# Altium footprint library Hydrolib_pcb.PcbLib: 101 footprints (part 4 of 7)
Each footprint in its own frame and in the unit in brackets; x right, y up, seen from the top. Pads: shape width x height; smd on the part's side, far side on the other; paste and mask are expansions set on the pad; w line width, h text height; cw(c..) or ccw(c..) is an arc to the next point about the centre after c.
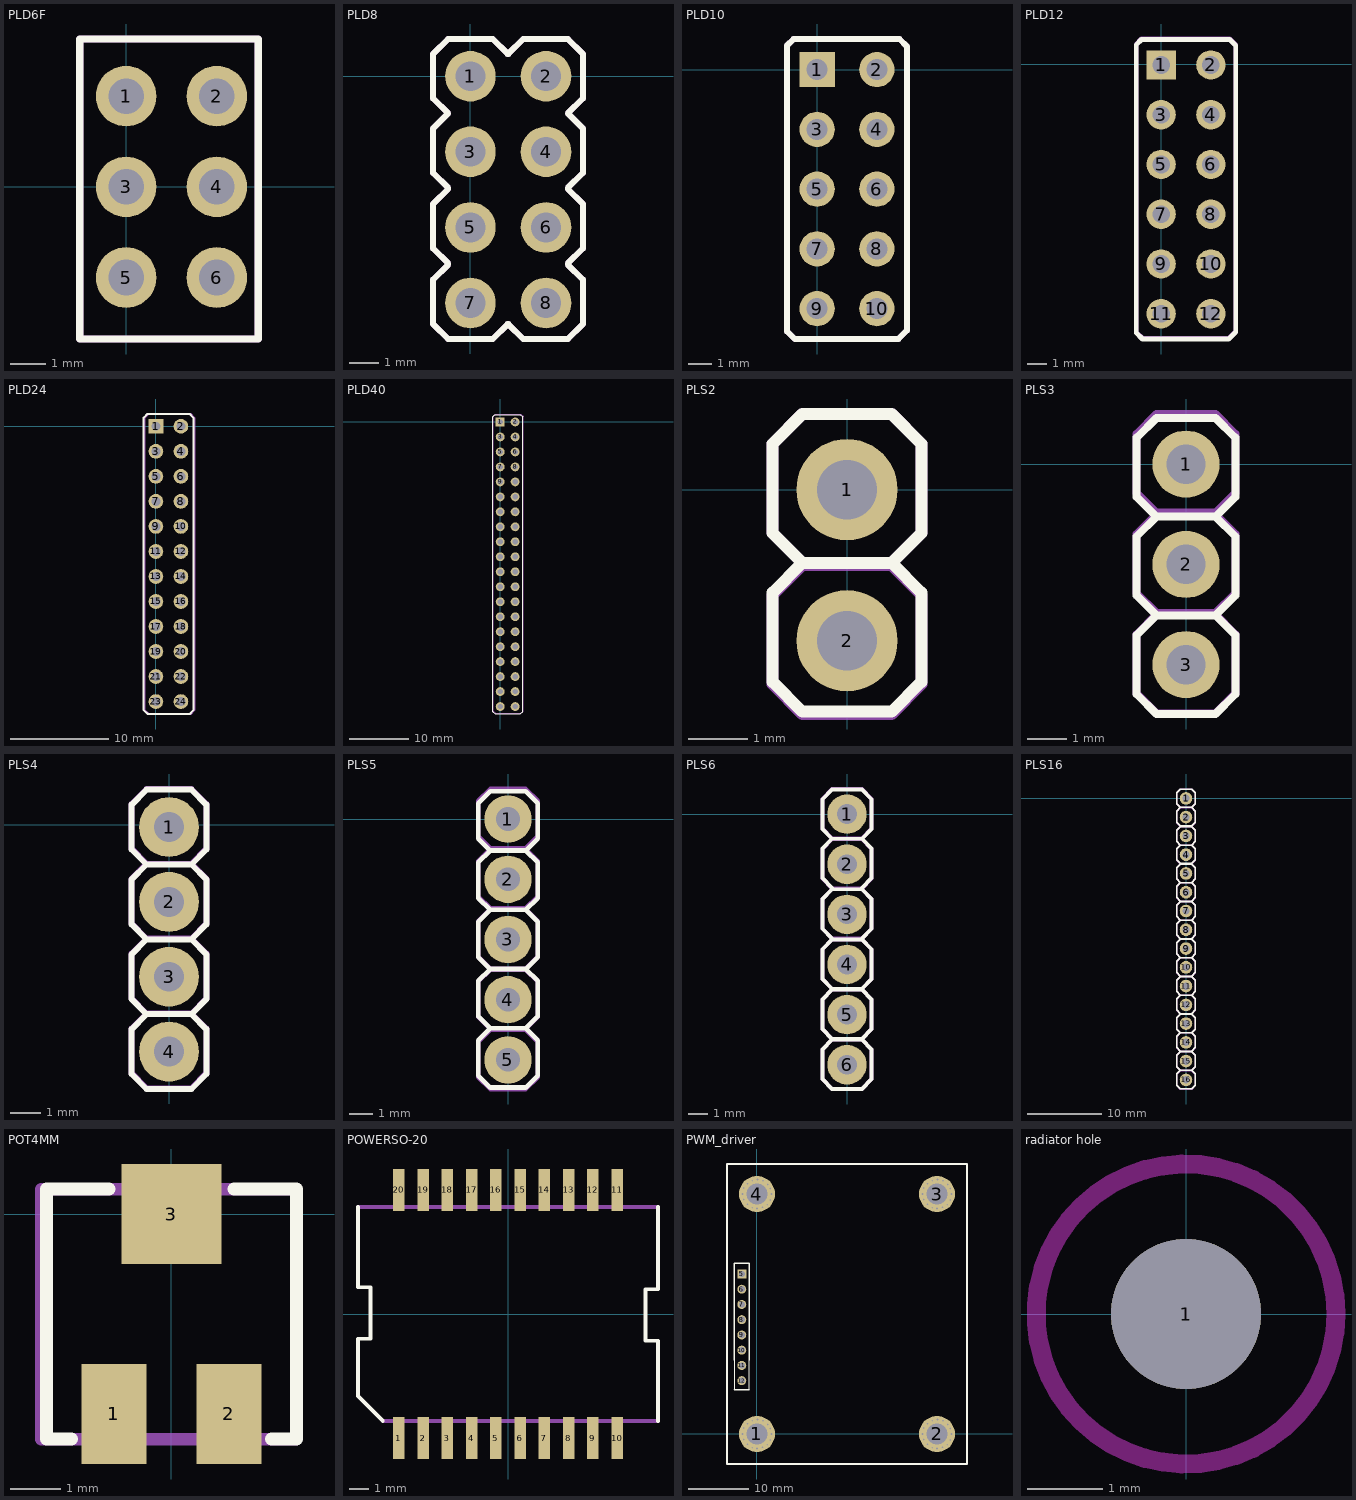
[diagram p3: the footprints below, top view; thin cyan lines are the x and y axes]

## PLD6F [mm]
pads (6):
  round 1.7 hole 1 paste+0: 1(0,2.54) 2(2.54,2.54) 3(0,0) 4(2.54,0) 5(0,-2.54) 6(2.54,-2.54)
Top Overlay:
  lines w0.2: -1.3,-4.26 -1.3,4.14 3.7,4.14 3.7,-4.26 -1.3,-4.26
Pattern top:
  lines w0.2: 3.7,-4.26 3.7,4.14 ; 3.7,-4.26 3.7,4.14 ; 3.7,-4.26 -1.3,-4.26 -1.3,4.14 3.7,4.14
  text ".Designator" at -2.7,5.04 h2.15
3D body "DS1023-2x3SF11.stp": height 8.5, standoff -3, extent -1.3,-4.27 3.7,4.15

## PLD8 [mm]
pads (8):
  round 1.7 hole 1 paste+0: 1(0,0) 2(2.54,0) 3(0,-2.54) 4(2.54,-2.54) 5(0,-5.08) 6(2.54,-5.08) 7(0,-7.62) 8(2.54,-7.62)
Top Overlay:
  lines w0.2: -0.75,-6.33 -1.25,-6.83 -1.25,-8.33 -0.75,-8.83 0.75,-8.83 1.25,-8.33 ; -0.75,-6.29 -1.25,-5.79 -1.25,-4.29 -0.75,-3.79 ; -0.75,-3.75 -1.25,-3.25 -1.25,-1.75 -0.75,-1.25 -1.25,-0.75 -1.25,0.75 -0.75,1.25 0.75,1.25 1.25,0.75 ; 1.275,-8.33 1.775,-8.83 3.275,-8.83 3.775,-8.33 3.775,-6.83 3.275,-6.33 ; 1.275,0.75 1.775,1.25 3.275,1.25 3.775,0.75 3.775,-0.75 3.275,-1.25 3.775,-1.75 3.775,-3.25 3.275,-3.75 ; 3.275,-6.29 3.775,-5.79 3.775,-4.29 3.275,-3.79
Pattern top:
  lines w0.2: -0.75,-6.33 -1.25,-6.83 -1.25,-8.33 -0.75,-8.83 0.75,-8.83 1.25,-8.33 ; -0.75,-6.29 -1.25,-5.79 -1.25,-4.29 -0.75,-3.79 ; -0.75,-3.75 -1.25,-3.25 -1.25,-1.75 -0.75,-1.25 -1.25,-0.75 -1.25,0.75 -0.75,1.25 0.75,1.25 1.25,0.75 ; 1.275,-8.33 1.775,-8.83 3.275,-8.83 3.775,-8.33 3.775,-6.83 3.275,-6.33 ; 1.275,0.75 1.775,1.25 3.275,1.25 3.775,0.75 3.775,-0.75 3.275,-1.25 3.775,-1.75 3.775,-3.25 3.275,-3.75 ; 3.275,-6.29 3.775,-5.79 3.775,-4.29 3.275,-3.79
  text ".Designator" at -2.9,2 h2.15
3D body "User Library-PLS-1.STEP": height 8.44, standoff -3, extent -1.27,-1.27 1.27,1.27
3D body "User Library-PLS-1.STEP": height 8.44, standoff -3, extent 1.27,-1.27 3.81,1.27
3D body "User Library-PLS-1.STEP": height 8.44, standoff -3, extent -1.27,-3.81 1.27,-1.27
3D body "User Library-PLS-1.STEP": height 8.44, standoff -3, extent 1.27,-3.81 3.81,-1.27
3D body "User Library-PLS-1.STEP": height 8.44, standoff -3, extent 1.27,-6.35 3.81,-3.81
3D body "User Library-PLS-1.STEP": height 8.44, standoff -3, extent -1.27,-6.35 1.27,-3.81
3D body "User Library-PLS-1.STEP": height 8.44, standoff -3, extent 1.27,-8.89 3.81,-6.35
3D body "User Library-PLS-1.STEP": height 8.44, standoff -3, extent -1.27,-8.89 1.27,-6.35

## PLD10 [mm]
pads (10):
  rect 1.5x1.5 hole 0.9: 1(0,0)
  round 1.5 hole 0.9: 2(2.54,0) 3(0,-2.54) 4(2.54,-2.54) 5(0,-5.08) 6(2.54,-5.08) 7(0,-7.62) 8(2.54,-7.62) 9(0,-10.16) 10(2.54,-10.16)
Top Overlay:
  lines w0.254: -1.27,-11.13 -1.27,1.03 -1,1.3 3.5,1.3 3.81,0.99 3.81,-11.09 3.45,-11.45 -0.95,-11.45 -1.27,-11.13
Pattern top:
  lines w0.254: -1.27,-11.13 -1.27,1.03 -1,1.3 3.5,1.3 3.81,0.99 3.81,-11.09 3.45,-11.45 -0.95,-11.45 -1.27,-11.13
  text ".Designator" at -3.1,2.1 h2.15
3D body "User Library-PLS-1.STEP": height 8.44, standoff -3, extent -1.27,-1.27 1.27,1.27
3D body "User Library-PLS-1.STEP": height 8.44, standoff -3, extent 1.27,-1.27 3.81,1.27
3D body "User Library-PLS-1.STEP": height 8.44, standoff -3, extent -1.27,-3.81 1.27,-1.27
3D body "User Library-PLS-1.STEP": height 8.44, standoff -3, extent 1.27,-3.81 3.81,-1.27
3D body "User Library-PLS-1.STEP": height 8.44, standoff -3, extent -1.27,-6.35 1.27,-3.81
3D body "User Library-PLS-1.STEP": height 8.44, standoff -3, extent 1.27,-6.35 3.81,-3.81
3D body "User Library-PLS-1.STEP": height 8.44, standoff -3, extent 1.27,-8.89 3.81,-6.35
3D body "User Library-PLS-1.STEP": height 8.44, standoff -3, extent -1.27,-8.89 1.27,-6.35
3D body "User Library-PLS-1.STEP": height 8.44, standoff -3, extent -1.27,-11.43 1.27,-8.89
3D body "User Library-PLS-1.STEP": height 8.44, standoff -3, extent 1.27,-11.43 3.81,-8.89

## PLD12 [mm]
pads (12):
  rect 1.5x1.5 hole 0.9: 1(0,-0.025)
  round 1.5 hole 0.9: 2(2.54,-0.025) 3(0,-2.565) 4(2.54,-2.565) 5(0,-5.105) 6(2.54,-5.105) 7(0,-7.645) 8(2.54,-7.645) 9(0,-10.185) 10(2.54,-10.185) 11(0,-12.725) 12(2.54,-12.725)
Top Overlay:
  lines w0.254: -1.27,-13.7 -1.27,1.005 -1,1.275 3.5,1.275 3.81,0.965 3.81,-13.65 ; -1.27,-13.695 -0.95,-14.015 3.45,-14.015 3.81,-13.655
Pattern top:
  lines w0.254: -1.27,-13.675 -1.27,1.03 -1,1.3 3.5,1.3 3.81,0.99 3.81,-13.625 ; -1.27,-13.67 -0.95,-13.99 3.45,-13.99 3.81,-13.63
  text ".Designator" at -2.8,2.2 h2.15
3D body "User Library-PLS-1.STEP": height 8.44, standoff -3, extent 1.27,-11.455 3.81,-8.915
3D body "User Library-PLS-1.STEP": height 8.44, standoff -3, extent -1.27,-11.455 1.27,-8.915
3D body "User Library-PLS-1.STEP": height 8.44, standoff -3, extent -1.27,-8.915 1.27,-6.375
3D body "User Library-PLS-1.STEP": height 8.44, standoff -3, extent 1.27,-8.915 3.81,-6.375
3D body "User Library-PLS-1.STEP": height 8.44, standoff -3, extent 1.27,-6.375 3.81,-3.835
3D body "User Library-PLS-1.STEP": height 8.44, standoff -3, extent -1.27,-6.375 1.27,-3.835
3D body "User Library-PLS-1.STEP": height 8.44, standoff -3, extent 1.27,-3.835 3.81,-1.295
3D body "User Library-PLS-1.STEP": height 8.44, standoff -3, extent -1.27,-3.835 1.27,-1.295
3D body "User Library-PLS-1.STEP": height 8.44, standoff -3, extent 1.27,-1.295 3.81,1.245
3D body "User Library-PLS-1.STEP": height 8.44, standoff -3, extent -1.27,-1.295 1.27,1.245
3D body "User Library-PLS-1.STEP": height 8.44, standoff -3, extent -1.27,-13.995 1.27,-11.455
3D body "User Library-PLS-1.STEP": height 8.44, standoff -3, extent 1.27,-13.995 3.81,-11.455

## PLD24 [mm]
pads (24):
  rect 1.5x1.5 hole 0.9: 1(0,0)
  round 1.5 hole 0.9: 2(2.54,0) 3(0,-2.54) 4(2.54,-2.54) 5(0,-5.08) 6(2.54,-5.08) 7(0,-7.62) 8(2.54,-7.62) 9(0,-10.16) 10(2.54,-10.16) 11(0,-12.7) 12(2.54,-12.7) 13(0,-15.24) 14(2.54,-15.24) 15(0,-17.78) 16(2.54,-17.78) 17(0,-20.32) 18(2.54,-20.32) 19(0,-22.86) 20(2.54,-22.86) 21(0,-25.4) 22(2.54,-25.4) 23(0,-27.94) 24(2.54,-27.94)
Top Overlay:
  lines w0.2: -1.25,-28.8 -0.85,-29.2 3.425,-29.2 3.81,-28.815 3.81,0.865 3.425,1.25 -0.875,1.25 -1.25,0.875 -1.25,-28.8
Pattern top:
  lines w0.2: -1.15,-28.8 -0.75,-29.2 3.525,-29.2 3.91,-28.815 3.91,0.865 3.525,1.25 -0.775,1.25 -1.15,0.875 -1.15,-28.8
  text ".Designator" at -3,2.3 h2.15
3D body "User Library-PLS-1.STEP": height 8.44, standoff -3, extent -1.27,-1.27 1.27,1.27
3D body "User Library-PLS-1.STEP": height 8.44, standoff -3, extent 1.27,-1.27 3.81,1.27
3D body "User Library-PLS-1.STEP": height 8.44, standoff -3, extent -1.27,-3.81 1.27,-1.27
3D body "User Library-PLS-1.STEP": height 8.44, standoff -3, extent 1.27,-3.81 3.81,-1.27
3D body "User Library-PLS-1.STEP": height 8.44, standoff -3, extent -1.27,-6.35 1.27,-3.81
3D body "User Library-PLS-1.STEP": height 8.44, standoff -3, extent 1.27,-6.35 3.81,-3.81
3D body "User Library-PLS-1.STEP": height 8.44, standoff -3, extent -1.27,-8.89 1.27,-6.35
3D body "User Library-PLS-1.STEP": height 8.44, standoff -3, extent 1.27,-8.89 3.81,-6.35
3D body "User Library-PLS-1.STEP": height 8.44, standoff -3, extent -1.27,-11.43 1.27,-8.89
3D body "User Library-PLS-1.STEP": height 8.44, standoff -3, extent 1.27,-11.43 3.81,-8.89
3D body "User Library-PLS-1.STEP": height 8.44, standoff -3, extent -1.27,-13.97 1.27,-11.43
3D body "User Library-PLS-1.STEP": height 8.44, standoff -3, extent 1.27,-13.97 3.81,-11.43
3D body "User Library-PLS-1.STEP": height 8.44, standoff -3, extent -1.27,-16.51 1.27,-13.97
3D body "User Library-PLS-1.STEP": height 8.44, standoff -3, extent 1.27,-16.51 3.81,-13.97
3D body "User Library-PLS-1.STEP": height 8.44, standoff -3, extent -1.27,-19.05 1.27,-16.51
3D body "User Library-PLS-1.STEP": height 8.44, standoff -3, extent 1.27,-19.05 3.81,-16.51
3D body "User Library-PLS-1.STEP": height 8.44, standoff -3, extent -1.27,-21.59 1.27,-19.05
3D body "User Library-PLS-1.STEP": height 8.44, standoff -3, extent 1.27,-21.59 3.81,-19.05
3D body "User Library-PLS-1.STEP": height 8.44, standoff -3, extent -1.27,-24.13 1.27,-21.59
3D body "User Library-PLS-1.STEP": height 8.44, standoff -3, extent 1.27,-24.13 3.81,-21.59
3D body "User Library-PLS-1.STEP": height 8.44, standoff -3, extent -1.27,-26.67 1.27,-24.13
3D body "User Library-PLS-1.STEP": height 8.44, standoff -3, extent 1.27,-26.67 3.81,-24.13
3D body "User Library-PLS-1.STEP": height 8.44, standoff -3, extent -1.27,-29.21 1.27,-26.67
3D body "User Library-PLS-1.STEP": height 8.44, standoff -3, extent 1.27,-29.21 3.81,-26.67

## PLD40 [mm]
pads (40):
  rect 1.5x1.5 hole 0.9: 1(0,0)
  round 1.5 hole 0.9: 2(2.54,0) 3(0,-2.54) 4(2.54,-2.54) 5(0,-5.08) 6(2.54,-5.08) 7(0,-7.62) 8(2.54,-7.62) 9(0,-10.16) 10(2.54,-10.16) 11(0,-12.7) 12(2.54,-12.7) 13(0,-15.24) 14(2.54,-15.24) 15(0,-17.78) 16(2.54,-17.78) 17(0,-20.32) 18(2.54,-20.32) 19(0,-22.86) 20(2.54,-22.86) 21(0,-25.4) 22(2.54,-25.4) 23(0,-27.94) 24(2.54,-27.94) 25(0,-30.475) 26(2.54,-30.475) 27(0,-33.015) 28(2.54,-33.015) 29(0,-35.555) 30(2.54,-35.555) 31(0,-38.095) 32(2.54,-38.095) 33(0,-40.635) 34(2.54,-40.635) 35(0,-43.175) 36(2.54,-43.175) 37(0,-45.715) 38(2.54,-45.715) 39(0,-48.255) 40(2.54,-48.255)
Top Overlay:
  lines w0.2: -1.25,-49.115 -1.25,-28.8 -1.25,0.875 -0.875,1.25 3.425,1.25 3.81,0.865 3.81,-28.815 3.81,-49.13 3.425,-49.515 -0.85,-49.515 -1.25,-49.115
Pattern top:
  lines w0.2: -1.15,-49.015 -1.15,-28.7 -1.15,0.975 -0.775,1.35 3.525,1.35 3.91,0.965 3.91,-28.715 3.91,-49.03 3.525,-49.415 -0.75,-49.415 -1.15,-49.015
  text ".Designator" at -3.1,2.3 h2.15
3D body "User Library-PLS-1.STEP": height 8.44, standoff -3, extent 1.27,-49.525 3.81,-46.985
3D body "User Library-PLS-1.STEP": height 8.44, standoff -3, extent -1.27,-49.525 1.27,-46.985
3D body "User Library-PLS-1.STEP": height 8.44, standoff -3, extent 1.27,-46.985 3.81,-44.445
3D body "User Library-PLS-1.STEP": height 8.44, standoff -3, extent -1.27,-46.985 1.27,-44.445
3D body "User Library-PLS-1.STEP": height 8.44, standoff -3, extent 1.27,-44.445 3.81,-41.905
3D body "User Library-PLS-1.STEP": height 8.44, standoff -3, extent -1.27,-44.445 1.27,-41.905
3D body "User Library-PLS-1.STEP": height 8.44, standoff -3, extent 1.27,-41.905 3.81,-39.365
3D body "User Library-PLS-1.STEP": height 8.44, standoff -3, extent -1.27,-41.905 1.27,-39.365
3D body "User Library-PLS-1.STEP": height 8.44, standoff -3, extent 1.27,-39.365 3.81,-36.825
3D body "User Library-PLS-1.STEP": height 8.44, standoff -3, extent -1.27,-39.365 1.27,-36.825
3D body "User Library-PLS-1.STEP": height 8.44, standoff -3, extent 1.27,-36.825 3.81,-34.285
3D body "User Library-PLS-1.STEP": height 8.44, standoff -3, extent -1.27,-36.825 1.27,-34.285
3D body "User Library-PLS-1.STEP": height 8.44, standoff -3, extent 1.27,-34.285 3.81,-31.745
3D body "User Library-PLS-1.STEP": height 8.44, standoff -3, extent -1.27,-34.285 1.27,-31.745
3D body "User Library-PLS-1.STEP": height 8.44, standoff -3, extent 1.27,-31.745 3.81,-29.205
3D body "User Library-PLS-1.STEP": height 8.44, standoff -3, extent -1.27,-31.745 1.27,-29.205
3D body "User Library-PLS-1.STEP": height 8.44, standoff -3, extent -1.27,-1.27 1.27,1.27
3D body "User Library-PLS-1.STEP": height 8.44, standoff -3, extent 1.27,-1.27 3.81,1.27
3D body "User Library-PLS-1.STEP": height 8.44, standoff -3, extent -1.27,-3.81 1.27,-1.27
3D body "User Library-PLS-1.STEP": height 8.44, standoff -3, extent 1.27,-3.81 3.81,-1.27
3D body "User Library-PLS-1.STEP": height 8.44, standoff -3, extent -1.27,-6.35 1.27,-3.81
3D body "User Library-PLS-1.STEP": height 8.44, standoff -3, extent 1.27,-6.35 3.81,-3.81
3D body "User Library-PLS-1.STEP": height 8.44, standoff -3, extent -1.27,-8.89 1.27,-6.35
3D body "User Library-PLS-1.STEP": height 8.44, standoff -3, extent 1.27,-8.89 3.81,-6.35
3D body "User Library-PLS-1.STEP": height 8.44, standoff -3, extent -1.27,-11.43 1.27,-8.89
3D body "User Library-PLS-1.STEP": height 8.44, standoff -3, extent 1.27,-11.43 3.81,-8.89
3D body "User Library-PLS-1.STEP": height 8.44, standoff -3, extent -1.27,-13.97 1.27,-11.43
3D body "User Library-PLS-1.STEP": height 8.44, standoff -3, extent 1.27,-13.97 3.81,-11.43
3D body "User Library-PLS-1.STEP": height 8.44, standoff -3, extent -1.27,-16.51 1.27,-13.97
3D body "User Library-PLS-1.STEP": height 8.44, standoff -3, extent 1.27,-16.51 3.81,-13.97
3D body "User Library-PLS-1.STEP": height 8.44, standoff -3, extent -1.27,-19.05 1.27,-16.51
3D body "User Library-PLS-1.STEP": height 8.44, standoff -3, extent 1.27,-19.05 3.81,-16.51
3D body "User Library-PLS-1.STEP": height 8.44, standoff -3, extent -1.27,-21.59 1.27,-19.05
3D body "User Library-PLS-1.STEP": height 8.44, standoff -3, extent 1.27,-21.59 3.81,-19.05
3D body "User Library-PLS-1.STEP": height 8.44, standoff -3, extent -1.27,-24.13 1.27,-21.59
3D body "User Library-PLS-1.STEP": height 8.44, standoff -3, extent 1.27,-24.13 3.81,-21.59
3D body "User Library-PLS-1.STEP": height 8.44, standoff -3, extent -1.27,-26.67 1.27,-24.13
3D body "User Library-PLS-1.STEP": height 8.44, standoff -3, extent 1.27,-26.67 3.81,-24.13
3D body "User Library-PLS-1.STEP": height 8.44, standoff -3, extent -1.27,-29.21 1.27,-26.67
3D body "User Library-PLS-1.STEP": height 8.44, standoff -3, extent 1.27,-29.21 3.81,-26.67

## PLS2 [mm]
pads (2):
  round 1.7 hole 1 paste+0: 1(0,0) 2(0,-2.54)
Top Overlay:
  lines w0.2: -0.75,-1.23 0.75,-1.23 ; -0.75,-1.23 -1.25,-1.73 -1.25,-3.23 -0.75,-3.73 0.75,-3.73 1.25,-3.23 1.25,-1.73 0.75,-1.23 ; -0.75,-1.23 -1.25,-0.73 -1.25,0.77 -0.75,1.27 0.75,1.27 1.25,0.77 1.25,-0.73 0.75,-1.23
Pattern top:
  lines w0.2: -1.25,-3.27 -0.75,-3.77 0.75,-3.77 1.25,-3.27 1.25,-1.77 0.75,-1.27 -0.75,-1.27 -1.25,-1.77 -1.25,-3.27 ; -1.25,-0.73 -0.75,-1.23 0.75,-1.23 1.25,-0.73 1.25,0.77 0.75,1.27 -0.75,1.27 -1.25,0.77 -1.25,-0.73
  text ".Designator" at -4.2,1.9 h2.15
3D body "User Library-PLS-1.STEP": height 8.44, standoff -3, extent -1.27,-3.81 1.27,-1.27
3D body "User Library-PLS-1.STEP": height 8.44, standoff -3, extent -1.27,-1.27 1.27,1.27

## PLS3 [mm]
pads (3):
  round 1.7 hole 1 paste+0: 1(0,0) 2(0,-2.54) 3(0,-5.08)
Top Overlay:
  lines w0.2: -0.75,-3.83 -1.25,-3.33 -1.25,-1.83 -0.75,-1.33 ; -0.75,-3.83 -1.25,-4.33 -1.25,-5.83 -0.75,-6.33 0.75,-6.33 1.25,-5.83 1.25,-4.33 0.75,-3.83 ; -0.75,-3.83 0.75,-3.83 ; -0.75,-1.33 -1.25,-0.83 -1.25,0.67 -0.75,1.17 0.75,1.17 1.25,0.67 1.25,-0.83 0.75,-1.33 ; -0.75,-1.33 0.75,-1.33 ; 0.75,-3.83 1.25,-3.33 1.25,-1.83 0.75,-1.33
Pattern top:
  lines w0.2: -1.25,-5.81 -1.25,-4.31 -0.75,-3.81 0.75,-3.81 1.25,-4.31 1.25,-5.81 0.75,-6.31 -0.75,-6.31 -1.25,-5.81 ; -1.25,-3.27 -1.25,-1.77 -0.75,-1.27 0.75,-1.27 1.25,-1.77 1.25,-3.27 0.75,-3.77 -0.75,-3.77 -1.25,-3.27 ; -1.25,-0.73 -1.25,0.77 -0.75,1.27 0.75,1.27 1.25,0.77 1.25,-0.73 0.75,-1.23 -0.75,-1.23 -1.25,-0.73
  text ".Designator" at -4.3,1.9 h2.15
3D body "User Library-PLS-1.STEP": height 8.44, standoff -3, extent -1.27,-1.27 1.27,1.27
3D body "User Library-PLS-1.STEP": height 8.44, standoff -3, extent -1.27,-3.81 1.27,-1.27
3D body "User Library-PLS-1.STEP": height 8.44, standoff -3, extent -1.27,-6.35 1.27,-3.81

## PLS4 [mm]
pads (4):
  round 2 hole 1: 1(0,-0.08) 2(0,-2.58) 3(0,-5.08) 4(0,-7.58)
Top Overlay:
  lines w0.2: -0.75,-6.33 0.75,-6.33 ; -0.75,-6.33 -1.25,-5.83 -1.25,-4.33 -0.75,-3.83 ; -0.75,-6.33 -1.25,-6.83 -1.25,-8.33 -0.75,-8.83 0.75,-8.83 1.25,-8.33 1.25,-6.83 0.75,-6.33 ; -0.75,-3.83 -1.25,-3.33 -1.25,-1.83 -0.75,-1.33 ; -0.75,-3.83 0.75,-3.83 ; -0.75,-1.33 0.75,-1.33 ; -0.75,-1.33 -1.25,-0.83 -1.25,0.67 -0.75,1.17 0.75,1.17 1.25,0.67 1.25,-0.83 0.75,-1.33 ; 0.75,-6.33 1.25,-5.83 1.25,-4.33 0.75,-3.83 ; 0.75,-3.83 1.25,-3.33 1.25,-1.83 0.75,-1.33
Pattern top:
  lines w0.2: -0.75,-6.31 -1.25,-5.81 -1.25,-4.31 -0.75,-3.81 ; -0.75,-6.31 0.75,-6.31 ; -0.75,-6.31 0.75,-6.31 ; -0.75,-6.31 -1.25,-6.81 -1.25,-8.31 -0.75,-8.81 0.75,-8.81 1.25,-8.31 1.25,-6.81 0.75,-6.31 ; -0.75,-3.81 -1.25,-3.31 -1.25,-1.81 -0.75,-1.31 ; -0.75,-3.81 0.75,-3.81 ; -0.75,-3.81 0.75,-3.81 ; -0.75,-1.31 -1.25,-0.81 -1.25,0.69 -0.75,1.19 0.75,1.19 1.25,0.69 1.25,-0.81 0.75,-1.31 ; -0.75,-1.31 0.75,-1.31 ; -0.75,-1.31 0.75,-1.31 ; 0.75,-6.31 1.25,-5.81 1.25,-4.31 0.75,-3.81 ; 0.75,-3.81 1.25,-3.31 1.25,-1.81 0.75,-1.31
  text ".Designator" at -4.2,1.9 h2.15
3D body "User Library-PLS-1.STEP": height 8.44, standoff -3, extent -1.27,-8.93 1.27,-6.39
3D body "User Library-PLS-1.STEP": height 8.44, standoff -3, extent -1.27,-1.35 1.27,1.19
3D body "User Library-PLS-1.STEP": height 8.44, standoff -3, extent -1.27,-3.89 1.27,-1.35
3D body "User Library-PLS-1.STEP": height 8.44, standoff -3, extent -1.27,-6.43 1.27,-3.89

## PLS5 [mm]
pads (5):
  round 2 hole 1: 1(0,0) 2(0,-2.54) 3(0,-5.08) 4(0,-7.62) 5(0,-10.16)
Top Overlay:
  lines w0.2: -0.75,-8.83 0.75,-8.83 ; -0.75,-8.83 -1.25,-9.33 -1.25,-10.83 -0.75,-11.33 0.75,-11.33 1.25,-10.83 1.25,-9.33 0.75,-8.83 ; -0.75,-8.83 -1.25,-8.33 -1.25,-6.83 -0.75,-6.33 ; -0.75,-8.83 0.75,-8.83 ; -0.75,-6.33 -1.25,-5.83 -1.25,-4.33 -0.75,-3.83 ; -0.75,-6.33 0.75,-6.33 ; -0.75,-3.83 -1.25,-3.33 -1.25,-1.83 -0.75,-1.33 ; -0.75,-3.83 0.75,-3.83 ; -0.75,-1.33 -1.25,-0.83 -1.25,0.67 -0.75,1.17 0.75,1.17 1.25,0.67 1.25,-0.83 0.75,-1.33 ; -0.75,-1.33 0.75,-1.33 ; 0.75,-8.83 1.25,-8.33 1.25,-6.83 0.75,-6.33 ; 0.75,-6.33 1.25,-5.83 1.25,-4.33 0.75,-3.83 ; 0.75,-3.83 1.25,-3.33 1.25,-1.83 0.75,-1.33
Pattern top:
  lines w0.2: -1.25,-10.89 -1.25,-9.39 -0.75,-8.89 0.75,-8.89 1.25,-9.39 1.25,-10.89 0.75,-11.39 -0.75,-11.39 -1.25,-10.89 ; -1.25,-8.35 -1.25,-6.85 -0.75,-6.35 0.75,-6.35 1.25,-6.85 1.25,-8.35 0.75,-8.85 -0.75,-8.85 -1.25,-8.35 ; -1.25,-5.81 -1.25,-4.31 -0.75,-3.81 0.75,-3.81 1.25,-4.31 1.25,-5.81 0.75,-6.31 -0.75,-6.31 -1.25,-5.81 ; -1.25,-3.27 -1.25,-1.77 -0.75,-1.27 0.75,-1.27 1.25,-1.77 1.25,-3.27 0.75,-3.77 -0.75,-3.77 -1.25,-3.27 ; -1.25,-0.73 -1.25,0.77 -0.75,1.27 0.75,1.27 1.25,0.77 1.25,-0.73 0.75,-1.23 -0.75,-1.23 -1.25,-0.73
  text ".Designator" at -4.4,2 h2.15
3D body "User Library-PLS-1.STEP": height 8.44, standoff -3, extent -1.27,-11.43 1.27,-8.89
3D body "User Library-PLS-1.STEP": height 8.44, standoff -3, extent -1.27,-8.89 1.27,-6.35
3D body "User Library-PLS-1.STEP": height 8.44, standoff -3, extent -1.27,-6.35 1.27,-3.81
3D body "User Library-PLS-1.STEP": height 8.44, standoff -3, extent -1.27,-3.81 1.27,-1.27
3D body "User Library-PLS-1.STEP": height 8.44, standoff -3, extent -1.27,-1.27 1.27,1.27

## PLS6 [mm]
pads (6):
  round 2 hole 1: 1(0,0) 2(0,-2.54) 3(0,-5.08) 4(0,-7.62) 5(0,-10.16) 6(0,-12.7)
Top Overlay:
  lines w0.2: -0.75,-6.31 -1.25,-5.81 -1.25,-4.31 -0.75,-3.81 0.75,-3.81 1.25,-4.31 1.25,-5.81 0.75,-6.31 ; -0.75,-3.75 -1.25,-3.25 -1.25,-1.75 -0.75,-1.25 ; 0.75,-3.75 1.25,-3.25 1.25,-1.75 0.75,-1.25 ; -0.75,-1.25 0.75,-1.25 ; -0.75,-1.25 -1.25,-0.75 -1.25,0.75 -0.75,1.25 0.75,1.25 1.25,0.75 1.25,-0.75 0.75,-1.25 ; -1.25,-13.43 -0.75,-13.93 0.75,-13.93 1.25,-13.43 1.25,-11.93 0.75,-11.43 -0.75,-11.43 -1.25,-11.93 -1.25,-13.43 ; -1.25,-10.89 -1.25,-9.39 -0.75,-8.89 0.75,-8.89 1.25,-9.39 1.25,-10.89 0.75,-11.39 -0.75,-11.39 -1.25,-10.89 ; -1.25,-8.35 -0.75,-8.85 0.75,-8.85 1.25,-8.35 1.25,-6.85 0.75,-6.35 -0.75,-6.35 -1.25,-6.85 -1.25,-8.35
Pattern top:
  lines w0.2: -1.25,-13.43 -1.25,-11.93 -0.75,-11.43 0.75,-11.43 1.25,-11.93 1.25,-13.43 0.75,-13.93 -0.75,-13.93 -1.25,-13.43 ; -1.25,-10.89 -1.25,-9.39 -0.75,-8.89 0.75,-8.89 1.25,-9.39 1.25,-10.89 0.75,-11.39 -0.75,-11.39 -1.25,-10.89 ; -1.25,-8.35 -1.25,-6.85 -0.75,-6.35 0.75,-6.35 1.25,-6.85 1.25,-8.35 0.75,-8.85 -0.75,-8.85 -1.25,-8.35 ; -1.25,-5.81 -1.25,-4.31 -0.75,-3.81 0.75,-3.81 1.25,-4.31 1.25,-5.81 0.75,-6.31 -0.75,-6.31 -1.25,-5.81 ; -1.25,-3.27 -1.25,-1.77 -0.75,-1.27 0.75,-1.27 1.25,-1.77 1.25,-3.27 0.75,-3.77 -0.75,-3.77 -1.25,-3.27 ; -1.25,-0.73 -1.25,0.77 -0.75,1.27 0.75,1.27 1.25,0.77 1.25,-0.73 0.75,-1.23 -0.75,-1.23 -1.25,-0.73
  text ".Designator" at -4.3,2 h2.15
3D body "User Library-PLS-1.STEP": height 8.44, standoff -3, extent -1.27,-13.97 1.27,-11.43
3D body "User Library-PLS-1.STEP": height 8.44, standoff -3, extent -1.27,-11.43 1.27,-8.89
3D body "User Library-PLS-1.STEP": height 8.44, standoff -3, extent -1.27,-8.89 1.27,-6.35
3D body "User Library-PLS-1.STEP": height 8.44, standoff -3, extent -1.27,-6.35 1.27,-3.81
3D body "User Library-PLS-1.STEP": height 8.44, standoff -3, extent -1.27,-3.81 1.27,-1.27
3D body "User Library-PLS-1.STEP": height 8.44, standoff -3, extent -1.27,-1.27 1.27,1.27

## PLS16 [mm]
pads (16):
  round 1.7 hole 1 paste+0: 1(0,0) 2(0,-2.54) 3(0,-5.08) 4(0,-7.62) 5(0,-10.16) 6(0,-12.7) 7(0,-15.24) 8(0,-17.78) 9(0,-20.32) 10(0,-22.86) 11(0,-25.4) 12(0,-27.94) 13(0,-30.48) 14(0,-33.02) 15(0,-35.56) 16(0,-38.1)
Top Overlay:
  lines w0.2: -0.75,-36.79 -1.25,-36.29 -1.25,-34.79 -0.75,-34.29 0.75,-34.29 1.25,-34.79 1.25,-36.29 0.75,-36.79 ; -0.75,-36.79 -1.25,-37.29 -1.25,-38.79 -0.75,-39.29 0.75,-39.29 1.25,-38.79 1.25,-37.29 0.75,-36.79 ; -0.75,-36.79 0.75,-36.79 ; -0.75,-31.71 -1.25,-31.21 -1.25,-29.71 -0.75,-29.21 0.75,-29.21 1.25,-29.71 1.25,-31.21 0.75,-31.71 ; -0.75,-31.71 -1.25,-32.21 -1.25,-33.71 -0.75,-34.21 0.75,-34.21 1.25,-33.71 1.25,-32.21 0.75,-31.71 ; -0.75,-31.71 0.75,-31.71 ; -0.75,-26.63 -1.25,-26.13 -1.25,-24.63 -0.75,-24.13 0.75,-24.13 1.25,-24.63 1.25,-26.13 0.75,-26.63 ; -0.75,-26.63 -1.25,-27.13 -1.25,-28.63 -0.75,-29.13 0.75,-29.13 1.25,-28.63 1.25,-27.13 0.75,-26.63 ; -0.75,-26.63 0.75,-26.63 ; -0.75,-21.55 -1.25,-21.05 -1.25,-19.55 -0.75,-19.05 0.75,-19.05 1.25,-19.55 1.25,-21.05 0.75,-21.55 ; -0.75,-21.55 -1.25,-22.05 -1.25,-23.55 -0.75,-24.05 0.75,-24.05 1.25,-23.55 1.25,-22.05 0.75,-21.55 ; -0.75,-21.55 0.75,-21.55 ; -0.75,-16.47 -1.25,-15.97 -1.25,-14.47 -0.75,-13.97 0.75,-13.97 1.25,-14.47 1.25,-15.97 0.75,-16.47 ; -0.75,-16.47 -1.25,-16.97 -1.25,-18.47 -0.75,-18.97 0.75,-18.97 1.25,-18.47 1.25,-16.97 0.75,-16.47 ; -0.75,-16.47 0.75,-16.47 ; -0.75,-11.39 -1.25,-10.89 -1.25,-9.39 -0.75,-8.89 0.75,-8.89 1.25,-9.39 1.25,-10.89 0.75,-11.39 ; -0.75,-11.39 -1.25,-11.89 -1.25,-13.39 -0.75,-13.89 0.75,-13.89 1.25,-13.39 1.25,-11.89 0.75,-11.39 ; -0.75,-11.39 0.75,-11.39 ; -0.75,-6.31 -1.25,-5.81 -1.25,-4.31 -0.75,-3.81 0.75,-3.81 1.25,-4.31 1.25,-5.81 0.75,-6.31 ; -0.75,-6.31 -1.25,-6.81 -1.25,-8.31 -0.75,-8.81 0.75,-8.81 1.25,-8.31 1.25,-6.81 0.75,-6.31 ; -0.75,-6.31 0.75,-6.31 ; -0.75,-1.23 -1.25,-0.73 -1.25,0.77 -0.75,1.27 0.75,1.27 1.25,0.77 1.25,-0.73 0.75,-1.23 ; -0.75,-1.23 -1.25,-1.73 -1.25,-3.23 -0.75,-3.73 0.75,-3.73 1.25,-3.23 1.25,-1.73 0.75,-1.23 ; -0.75,-1.23 0.75,-1.23
Pattern top:
  lines w0.2: -1.25,-10.89 -0.75,-11.39 ; -1.25,-10.89 -1.25,-9.39 ; -1.25,-10.89 -0.75,-11.39 ; -1.25,-10.89 -1.25,-9.39 ; -1.25,-9.39 -0.75,-8.89 ; -1.25,-9.39 -0.75,-8.89 ; -0.75,-11.39 0.75,-11.39 ; -0.75,-11.39 0.75,-11.39 ; -0.75,-8.89 0.75,-8.89 ; -0.75,-8.89 0.75,-8.89 ; 0.75,-11.39 1.25,-10.89 ; 0.75,-11.39 1.25,-10.89 ; 0.75,-8.89 1.25,-9.39 ; 0.75,-8.89 1.25,-9.39 ; 1.25,-10.89 1.25,-9.39 ; 1.25,-10.89 1.25,-9.39 ; -1.25,-38.83 -0.75,-39.33 0.75,-39.33 1.25,-38.83 1.25,-37.33 0.75,-36.83 -0.75,-36.83 -1.25,-37.33 -1.25,-38.83 ; -1.25,-36.29 -0.75,-36.79 0.75,-36.79 1.25,-36.29 1.25,-34.79 0.75,-34.29 -0.75,-34.29 -1.25,-34.79 -1.25,-36.29 ; -1.25,-33.75 -0.75,-34.25 0.75,-34.25 1.25,-33.75 1.25,-32.25 0.75,-31.75 -0.75,-31.75 -1.25,-32.25 -1.25,-33.75 ; -1.25,-31.21 -0.75,-31.71 0.75,-31.71 1.25,-31.21 1.25,-29.71 0.75,-29.21 -0.75,-29.21 -1.25,-29.71 -1.25,-31.21 ; -1.25,-28.67 -0.75,-29.17 0.75,-29.17 1.25,-28.67 1.25,-27.17 0.75,-26.67 -0.75,-26.67 -1.25,-27.17 -1.25,-28.67 ; -1.25,-26.13 -0.75,-26.63 0.75,-26.63 1.25,-26.13 1.25,-24.63 0.75,-24.13 -0.75,-24.13 -1.25,-24.63 -1.25,-26.13 ; -1.25,-23.59 -0.75,-24.09 0.75,-24.09 1.25,-23.59 1.25,-22.09 0.75,-21.59 -0.75,-21.59 -1.25,-22.09 -1.25,-23.59 ; -1.25,-21.05 -0.75,-21.55 0.75,-21.55 1.25,-21.05 1.25,-19.55 0.75,-19.05 -0.75,-19.05 -1.25,-19.55 -1.25,-21.05 ; -1.25,-18.51 -0.75,-19.01 0.75,-19.01 1.25,-18.51 1.25,-17.01 0.75,-16.51 -0.75,-16.51 -1.25,-17.01 -1.25,-18.51 ; -1.25,-15.97 -0.75,-16.47 0.75,-16.47 1.25,-15.97 1.25,-14.47 0.75,-13.97 -0.75,-13.97 -1.25,-14.47 -1.25,-15.97 ; -1.25,-13.43 -0.75,-13.93 0.75,-13.93 1.25,-13.43 1.25,-11.93 0.75,-11.43 -0.75,-11.43 -1.25,-11.93 -1.25,-13.43 ; -1.25,-8.35 -0.75,-8.85 0.75,-8.85 1.25,-8.35 1.25,-6.85 0.75,-6.35 -0.75,-6.35 -1.25,-6.85 -1.25,-8.35 ; -1.25,-5.81 -0.75,-6.31 0.75,-6.31 1.25,-5.81 1.25,-4.31 0.75,-3.81 -0.75,-3.81 -1.25,-4.31 -1.25,-5.81 ; -1.25,-3.27 -0.75,-3.77 0.75,-3.77 1.25,-3.27 1.25,-1.77 0.75,-1.27 -0.75,-1.27 -1.25,-1.77 -1.25,-3.27 ; -1.25,-0.73 -0.75,-1.23 0.75,-1.23 1.25,-0.73 1.25,0.77 0.75,1.27 -0.75,1.27 -1.25,0.77 -1.25,-0.73
  text ".Designator" at -3.9,2.2 h2.15
3D body "User Library-PLS-1.STEP": height 8.44, standoff -3, extent -1.27,-1.27 1.27,1.27
3D body "User Library-PLS-1.STEP": height 8.44, standoff -3, extent -1.27,-3.81 1.27,-1.27
3D body "User Library-PLS-1.STEP": height 8.44, standoff -3, extent -1.27,-6.35 1.27,-3.81
3D body "User Library-PLS-1.STEP": height 8.44, standoff -3, extent -1.27,-8.89 1.27,-6.35
3D body "User Library-PLS-1.STEP": height 8.44, standoff -3, extent -1.27,-11.43 1.27,-8.89
3D body "User Library-PLS-1.STEP": height 8.44, standoff -3, extent -1.27,-13.97 1.27,-11.43
3D body "User Library-PLS-1.STEP": height 8.44, standoff -3, extent -1.27,-16.51 1.27,-13.97
3D body "User Library-PLS-1.STEP": height 8.44, standoff -3, extent -1.27,-19.05 1.27,-16.51
3D body "User Library-PLS-1.STEP": height 8.44, standoff -3, extent -1.27,-21.59 1.27,-19.05
3D body "User Library-PLS-1.STEP": height 8.44, standoff -3, extent -1.27,-24.13 1.27,-21.59
3D body "User Library-PLS-1.STEP": height 8.44, standoff -3, extent -1.27,-26.67 1.27,-24.13
3D body "User Library-PLS-1.STEP": height 8.44, standoff -3, extent -1.27,-29.21 1.27,-26.67
3D body "User Library-PLS-1.STEP": height 8.44, standoff -3, extent -1.27,-31.75 1.27,-29.21
3D body "User Library-PLS-1.STEP": height 8.44, standoff -3, extent -1.27,-34.29 1.27,-31.75
3D body "User Library-PLS-1.STEP": height 8.44, standoff -3, extent -1.27,-36.83 1.27,-34.29
3D body "User Library-PLS-1.STEP": height 8.44, standoff -3, extent -1.27,-39.37 1.27,-36.83

## POT4MM [mm]
pads (3):
  rect 1.3x2 smd: 1(-1.15,-4) 2(1.15,-4)
  rect 2x2 smd: 3(0,0)
Top Overlay:
  lines w0.254: -2,-4.5 -2.5,-4.5 -2.5,0.5 -1.25,0.5 ; 1.25,0.5 2.5,0.5 2.5,-4.5 2,-4.5
Pattern top:
  lines w0.25: -2.6,-4.5 -2.6,0.5 2.5,0.5 2.5,-4.5 -2.6,-4.5
  text ".Designator" at -2.6,1.4 h2.15
3D body "3303X003.stp": height 1.31, standoff -0.04, extent -1.5,-3.873 1.497,-0.127

## POWERSO-20 [mm]
pads (20):
  rect 0.6x2.2 smd: 1(-5.715,-6.5) 2(-4.445,-6.5) 3(-3.175,-6.5) 4(-1.905,-6.5) 5(-0.635,-6.5) 6(0.635,-6.5) 7(1.905,-6.5) 8(3.175,-6.5) 9(4.445,-6.5) 10(5.715,-6.5) 11(5.715,6.5) 12(4.445,6.5) 13(3.175,6.5) 14(1.905,6.5) 15(0.635,6.5) 16(-0.635,6.5) 17(-1.905,6.5) 18(-3.175,6.5) 19(-4.445,6.5) 20(-5.715,6.5)
Top Overlay:
  lines w0.203: -7.86,5.6 -7.86,1.4 -7.2,1.4 -7.2,-1.3 -7.86,-1.3 -7.86,-4.3 -6.56,-5.6 ; 7.86,-5.6 7.86,-1.4 7.2,-1.4 7.2,1.3 7.86,1.3 7.86,5.6
Mechanical 13:
  region: -5.47,-7.236 -5.973,-7.236 -5.973,-5.7 -5.47,-5.7
  region: -4.2,-7.237 -4.701,-7.237 -4.701,-5.7 -4.2,-5.7
  region: -2.93,-7.242 -3.431,-7.242 -3.431,-5.7 -2.93,-5.7
  region: -1.66,-7.223 -2.151,-7.223 -2.151,-5.7 -1.66,-5.7
  region: -0.39,-7.24 -0.882,-7.24 -0.882,-5.7 -0.39,-5.7
  region: 0.88,-7.228 0.39,-7.228 0.39,-5.7 0.88,-5.7
  region: 2.15,-7.223 1.661,-7.223 1.661,-5.7 2.15,-5.7
  region: 3.42,-7.233 2.935,-7.233 2.935,-5.7 3.42,-5.7
  region: 4.69,-7.223 4.201,-7.223 4.201,-5.7 4.69,-5.7
  region: 5.96,-7.242 5.487,-7.242 5.487,-5.7 5.96,-5.7
  region: 5.96,5.71 5.48,5.71 5.48,7.22 5.96,7.22
  region: 4.69,5.711 4.208,5.711 4.208,7.22 4.69,7.22
  region: 3.42,5.711 2.935,5.711 2.935,7.22 3.42,7.22
  region: 2.15,5.706 1.662,5.706 1.662,7.22 2.15,7.22
  region: 0.88,5.716 0.391,5.716 0.391,7.22 0.88,7.22
  region: -0.39,5.715 -0.882,5.715 -0.882,7.22 -0.39,7.22
  region: -1.66,5.717 -2.156,5.717 -2.156,7.22 -1.66,7.22
  region: -2.93,5.707 -3.424,5.707 -3.424,7.22 -2.93,7.22
  region: -4.2,5.705 -4.694,5.705 -4.694,7.22 -4.2,7.22
  region: -5.47,5.709 -5.969,5.709 -5.969,7.22 -5.47,7.22
  lines w0.203: -7.86,5.6 7.86,5.6 ; -6.56,-5.6 7.86,-5.6

## PWM_driver [mm]
pads (12):
  round 6 hole 3.5: 1(0,0) 2(30,0) 3(30,40) 4(0,40)
  rect 1.5x1.5 hole 1: 5(-2.54,26.67)
  round 1.5 hole 1: 6(-2.54,24.13) 7(-2.54,21.59) 8(-2.54,19.05) 9(-2.54,16.51) 10(-2.54,13.97) 11(-2.54,11.43) 12(-2.54,8.89)
via 0.1,2.4 diameter 0.7 hole 0.3
via 2.4,0 diameter 0.7 hole 0.3
via 0,-2.4 diameter 0.7 hole 0.3
via -2.4,0 diameter 0.7 hole 0.3
via -2.2,1 diameter 0.7 hole 0.3
via -1.6,1.7 diameter 0.7 hole 0.3
via -0.8,2.2 diameter 0.7 hole 0.3
via 1,2.2 diameter 0.7 hole 0.3
via 1.8,1.6 diameter 0.7 hole 0.3
via 2.2,0.9 diameter 0.7 hole 0.3
via -2.2,-0.9 diameter 0.7 hole 0.3
via -1.6,-1.7 diameter 0.7 hole 0.3
via -0.8,-2.3 diameter 0.7 hole 0.3
via 0.9,-2.2 diameter 0.7 hole 0.3
via 1.7,-1.8 diameter 0.7 hole 0.3
via 2.2,-1 diameter 0.7 hole 0.3
via 32.2,-1 diameter 0.7 hole 0.3
via 31.7,-1.8 diameter 0.7 hole 0.3
via 30.9,-2.2 diameter 0.7 hole 0.3
via 29.2,-2.3 diameter 0.7 hole 0.3
via 28.4,-1.7 diameter 0.7 hole 0.3
via 27.8,-0.9 diameter 0.7 hole 0.3
via 32.2,0.9 diameter 0.7 hole 0.3
via 31.8,1.6 diameter 0.7 hole 0.3
via 31,2.2 diameter 0.7 hole 0.3
via 29.2,2.2 diameter 0.7 hole 0.3
via 28.4,1.7 diameter 0.7 hole 0.3
via 27.8,1 diameter 0.7 hole 0.3
via 27.6,0 diameter 0.7 hole 0.3
via 30,-2.4 diameter 0.7 hole 0.3
via 32.4,0 diameter 0.7 hole 0.3
via 30.1,2.4 diameter 0.7 hole 0.3
via 2.2,39 diameter 0.7 hole 0.3
via 1.7,38.2 diameter 0.7 hole 0.3
via 0.9,37.8 diameter 0.7 hole 0.3
via -0.8,37.7 diameter 0.7 hole 0.3
via -1.6,38.3 diameter 0.7 hole 0.3
via -2.2,39.1 diameter 0.7 hole 0.3
via 2.2,40.9 diameter 0.7 hole 0.3
via 1.8,41.6 diameter 0.7 hole 0.3
via 1,42.2 diameter 0.7 hole 0.3
via -0.8,42.2 diameter 0.7 hole 0.3
via -1.6,41.7 diameter 0.7 hole 0.3
via -2.2,41 diameter 0.7 hole 0.3
via -2.4,40 diameter 0.7 hole 0.3
via 0,37.6 diameter 0.7 hole 0.3
via 2.4,40 diameter 0.7 hole 0.3
via 0.1,42.4 diameter 0.7 hole 0.3
via 32.2,39 diameter 0.7 hole 0.3
via 31.7,38.2 diameter 0.7 hole 0.3
via 30.9,37.8 diameter 0.7 hole 0.3
via 29.2,37.7 diameter 0.7 hole 0.3
via 28.4,38.3 diameter 0.7 hole 0.3
via 27.8,39.1 diameter 0.7 hole 0.3
via 32.2,40.9 diameter 0.7 hole 0.3
via 31.8,41.6 diameter 0.7 hole 0.3
via 31,42.2 diameter 0.7 hole 0.3
via 29.2,42.2 diameter 0.7 hole 0.3
via 28.4,41.7 diameter 0.7 hole 0.3
via 27.8,41 diameter 0.7 hole 0.3
via 27.6,40 diameter 0.7 hole 0.3
via 30,37.6 diameter 0.7 hole 0.3
via 32.4,40 diameter 0.7 hole 0.3
via 30.1,42.4 diameter 0.7 hole 0.3
Top Overlay:
  lines w0.2: -3.81,7.366 -3.81,28.448 -1.27,28.448 -1.27,7.366
  lines w0.254: -3.81,7.366 -1.27,7.366 ; -3.81,12.27 -3.81,28.45 -1.27,28.45 -1.27,12.27
  lines w0.3: -5,-5 -5,45 35,45 35,-5 -5,-5

## radiator hole [mm]
pads (1):
  round 2 hole 2: 1(0,0)
Top Layer keep-out:
  circle w0.254: c0,0 r2
Pattern top:
  text ".Designator" at -3.4,-4.2 h2.15